# Altium integrated library ALTIUM-WR-CRD.IntLib: 18 symbols
Pins are listed as number, name and electrical type; pins without a type are passive.

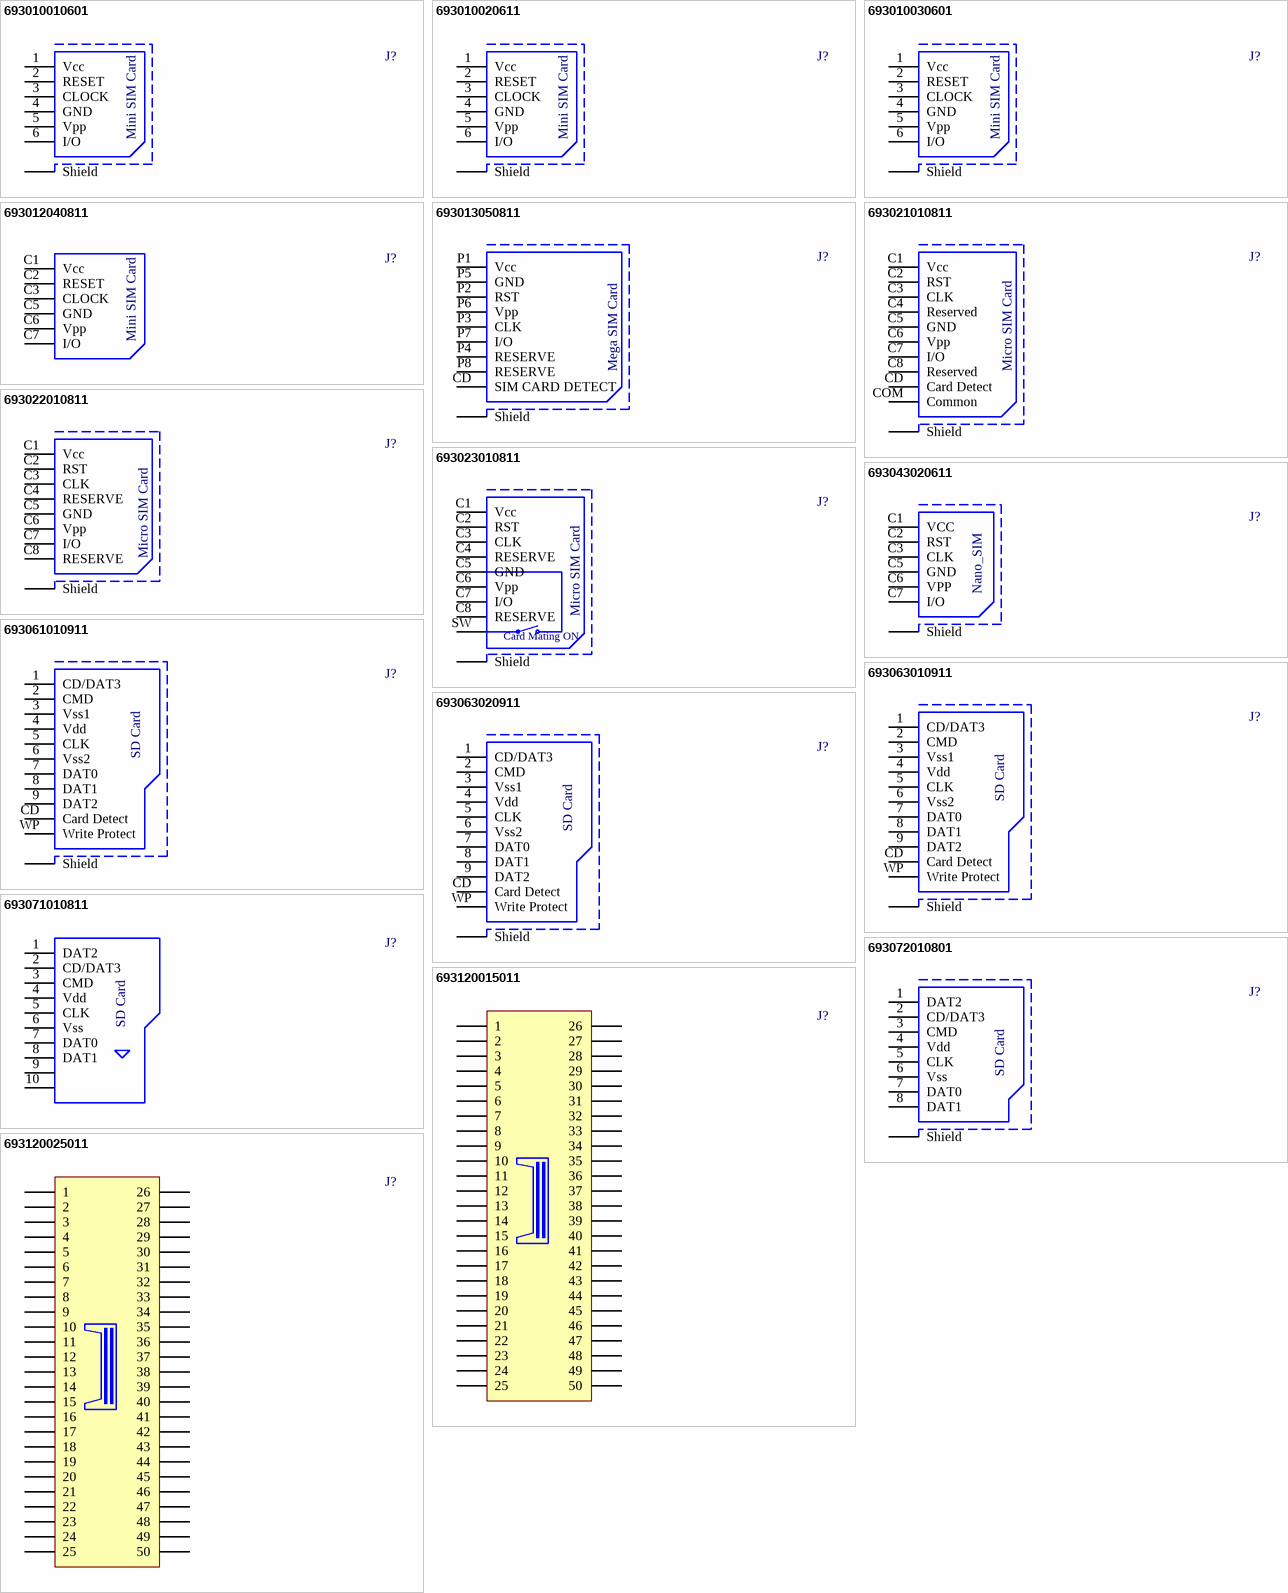
[diagram p0: symbols 693010010601 to 693120025011]

## 693010010601
designator J?
WR-CRD SIM Card Connector (Mini SIM) Header - 6 pins; PartNumber: 693010010601; Published: June 2016; Publisher: Wurth Elektronik; ComponentLink1Description: Manufacturer; ComponentLink1URL: http://www.we-online.de; ComponentLink2Description: Datasheet; ComponentLink2URL: http://katalog.we-online.de/em/datasheet/693010010601.pdf
footprint 693010010601 (WR-CRD Mini SIM_Standard Header 6 pins    1.7 Heigth)
pins: 1 Vcc, 2 RESET, 3 CLOCK, 4 GND, 5 Vpp, 6 I/O, Shield
text: Mini SIM Card

## 693010020611
designator J?
WR-CRD SIM Card Connector (Mini SIM) Header Shielded - 6 pins; PartNumber: 693010020611; Published: June 2016; Publisher: Wurth Elektronik; ComponentLink1Description: Manufacturer; ComponentLink1URL: http://www.we-online.de; ComponentLink2Description: Datasheet; ComponentLink2URL: http://katalog.we-online.de/em/datasheet/693010020611.pdf
footprint 693010020611 (WR-CRD Mini SIM_header_Shielded_6 pins    1.8 Heigth)
pins: 1 Vcc, 2 RESET, 3 CLOCK, 4 GND, 5 Vpp, 6 I/O, Shield
text: Mini SIM Card

## 693010030601
designator J?
WR-CRD SIM Card Connector (Mini SIM) Header Shielded - without card stop - 6 pins; PartNumber: 693010030601; Published: June 2016; Publisher: Wurth Elektronik; ComponentLink1Description: Manufacturer; ComponentLink1URL: http://www.we-online.de; ComponentLink2Description: Datasheet; ComponentLink2URL: http://katalog.we-online.de/em/datasheet/693010030601.pdf
footprint 693010030601 (WR-CRD Mini SIM_Card Stop_header_Shielded_ W/O card stop   6 pins    1.8 Heigth)
pins: 1 Vcc, 2 RESET, 3 CLOCK, 4 GND, 5 Vpp, 6 I/O, Shield
text: Mini SIM Card

## 693012040811
designator J?
WR-CRD SIM Card Connector (Mini SIM) - Hinge - 6 pins; PartNumber: 693012040811; Published: June 2016; Publisher: Wurth Elektronik; ComponentLink1Description: Manufacturer; ComponentLink1URL: http://www.we-online.de; ComponentLink2Description: Datasheet; ComponentLink2URL: http://katalog.we-online.de/em/datasheet/693012040811.pdf
footprint 693012040811 (WR-CRD mini SIM_Hinge type_6 pins_with cover shell_Housing Height 1.80mm)
pins: C1 Vcc, C2 RESET, C3 CLOCK, C5 GND, C6 Vpp, C7 I/O
text: Mini SIM Card

## 693013050811
designator J?
WR-CRD SIM Card Connector (Mega SIM) - Push & Push - with Card Detection - 8 pins; PartNumber: 693013050811; Published: June 2016; Publisher: Wurth Elektronik; ComponentLink1Description: Manufacturer; ComponentLink1URL: http://www.we-online.de; ComponentLink2Description: Datasheet; ComponentLink2URL: http://katalog.we-online.de/em/datasheet/693013050811.pdf
footprint 693013050811 (WR-CRD Mega SIM_Push and Push_8 pins_with Card Detection_Housing Height 1.50mm)
pins: CD SIM CARD DETECT, P1 Vcc, P2 RST, P3 CLK, P4 RESERVE, P5 GND, P6 Vpp, P7 I/O, P8 RESERVE, Shield
text: Mega SIM Card

## 693021010811
designator J?
WR-CRD Micro SIM Card Connector, Push & Push - with Card Detection; PartNumber: 693021010811; Published: Oct. 2016; Publisher: Wurth Elektronik; ComponentLink1Description: Manufacturer; ComponentLink1URL: http://www.we-online.de; ComponentLink2Description: Datasheet; ComponentLink2URL: http://katalog.we-online.de/em/datasheet/693021010811.pdf
footprint 693021010811 (Micro SIM Push & Push Type SMT - with Card Detection - 1.25mm Height)
pins: C1 Vcc, C2 RST, C3 CLK, C4 Reserved, C5 GND, C6 Vpp, C7 I/O, C8 Reserved, CD Card Detect, COM Common, Shield
text: Micro SIM Card

## 693022010811
designator J?
WR-CRD Micro SIM Card Connector Hinge Type; PartNumber: 693022010811; Published: June 2016; Publisher: Wurth Elektronik; ComponentLink1Description: Manufacturer; ComponentLink1URL: http://www.we-online.de; ComponentLink2Description: Datasheet; ComponentLink2URL: http://katalog.we-online.de/em/datasheet/693022010811.pdf
footprint 693022010811
pins: C1 Vcc, C2 RST, C3 CLK, C4 RESERVE, C5 GND, C6 Vpp, C7 I/O, C8 RESERVE, Shield
text: Micro SIM Card

## 693023010811
designator J?
WR-CRD Micro SIM Card Connector, Push & Push - with Card Detection; PartNumber: 693023010811; Published: June 2016; Publisher: Wurth Elektronik; ComponentLink1Description: Manufacturer; ComponentLink1URL: http://www.we-online.de; ComponentLink2Description: Datasheet; ComponentLink2URL: http://katalog.we-online.de/em/datasheet/693023010811.pdf
footprint 693023010811
pins: C1 Vcc, C2 RST, C3 CLK, C4 RESERVE, C5 GND, C6 Vpp, C7 I/O, C8 RESERVE, Shield, SW
text: Micro SIM Card; Card Mating ON

## 693043020611
designator J?
WR-CRD Nano SIM Card Connector, Push & Pull; PartNumber: 693043020611; Published: June 2016; Publisher: Wurth Elektronik; ComponentLink1Description: Manufacturer; ComponentLink1URL: http://www.we-online.de; ComponentLink2Description: Datasheet; ComponentLink2URL: http://katalog.we-online.de/em/datasheet/693043020611.pdf
footprint 693043020611
pins: C1 VCC, C2 RST, C3 CLK, C5 GND, C6 VPP, C7 I/O, Shield
text: Nano_SIM

## 693061010911
designator J?
WR-CRD SD Card Connector Push & Push - with Card Detection - 9 pins; PartNumber: 693061010911; Published: June 2016; Publisher: Wurth Elektronik; ComponentLink1Description: Manufacturer; ComponentLink1URL: http://www.we-online.de; ComponentLink2Description: Datasheet; ComponentLink2URL: http://katalog.we-online.de/em/datasheet/693061010911.pdf
footprint 693061010911 (WR-CRD SD_Push and Push_with card detection_9 pins)
pins: 1 CD/DAT3, 2 CMD, 3 Vss1, 4 Vdd, 5 CLK, 6 Vss2, 7 DAT0, 8 DAT1, 9 DAT2, CD Card Detect, Shield, WP Write Protect
text: SD Card

## 693063010911
designator J?
WR-CRD SD Card Connector Push & Pull - with Card Detection - 9 pins; PartNumber: 693063010911; Published: June 2016; Publisher: Wurth Elektronik; ComponentLink1Description: Manufacturer; ComponentLink1URL: http://www.we-online.de; ComponentLink2Description: Datasheet; ComponentLink2URL: http://katalog.we-online.de/em/datasheet/693063010911.pdf
footprint 693063010911 (WR-CRD SD_Push and Pull_with card detection_9 pins)
pins: 1 CD/DAT3, 2 CMD, 3 Vss1, 4 Vdd, 5 CLK, 6 Vss2, 7 DAT0, 8 DAT1, 9 DAT2, CD Card Detect, Shield, WP Write Protect
text: SD Card

## 693063020911
designator J?
WR-CRD SD Card Connector Push & Pull - Short Type - with Card Detection - 9 pins; PartNumber: 693063020911; Published: June 2016; Publisher: Wurth Elektronik; ComponentLink1Description: Manufacturer; ComponentLink1URL: http://www.we-online.de; ComponentLink2Description: Datasheet; ComponentLink2URL: http://katalog.we-online.de/em/datasheet/693063020911.pdf
footprint 693063020911 (WR-CRD SD_Push and Pull_Short Version with Card Detection_9 pins)
pins: 1 CD/DAT3, 2 CMD, 3 Vss1, 4 Vdd, 5 CLK, 6 Vss2, 7 DAT0, 8 DAT1, 9 DAT2, CD Card Detect, Shield, WP Write Protect
text: SD Card

## 693071010811
designator J?
WR-CRD Micro SD Card Connector Push & Push - 8 pins; PartNumber: 693071010811; Published: June 2016; Publisher: Wurth Elektronik; ComponentLink1Description: Manufacturer; ComponentLink1URL: http://www.we-online.de; ComponentLink2Description: Datasheet; ComponentLink2URL: http://katalog.we-online.de/em/datasheet/693071010811.pdf
footprint 693071010811 (WR-CRD Micro SD_Push and Push_Card Detection_8 pins)
pins: 1 DAT2, 2 CD/DAT3, 3 CMD, 4 Vdd, 5 CLK, 6 Vss, 7 DAT0, 8 DAT1, 9, 10
text: SD Card

## 693072010801
designator J?
WR-CRD Micro SD Card Connector - Hinge - 8 pins; PartNumber: 693072010801; Published: June 2016; Publisher: Wurth Elektronik; ComponentLink1Description: Manufacturer; ComponentLink1URL: http://www.we-online.de; ComponentLink2Description: Datasheet; ComponentLink2URL: http://katalog.we-online.de/em/datasheet/693072010801.pdf
footprint 693072010801 (WR-CRD Micro SD_Hinge_8 pins)
pins: 1 DAT2, 2 CD/DAT3, 3 CMD, 4 Vdd, 5 CLK, 6 Vss, 7 DAT0, 8 DAT1, Shield
text: SD Card

## 693120015011
designator J?
WR-CRD Compact Flash Card Connector - Header - 50 pins; PartNumber: 693120015011; Published: June 2016; Publisher: Wurth Elektronik; ComponentLink1Description: Manufacturer; ComponentLink1URL: http://www.we-online.de; ComponentLink2Description: Datasheet; ComponentLink2URL: http://katalog.we-online.de/em/datasheet/693120015011.pdf
footprint 693120015011 (WR-CRD Compact Flash_Header _50 pins)
pins: 1, 2, 3, 4, 5, 6, 7, 8, 9, 10, 11, 12, 13, 14, 15, 16, 17, 18, 19, 20, 21, 22, 23, 24, 25, 26, 27, 28, 29, 30, 31, 32, 33, 34, 35, 36, 37, 38, 39, 40, 41, 42, 43, 44, 45, 46, 47, 48, 49, 50

## 693120025011
designator J?
WR-CRD Compact Flash Card Connector - Header - Reverse type - 50 pins; PartNumber: 693120025011; Published: June 2016; Publisher: Wurth Elektronik; ComponentLink1Description: Manufacturer; ComponentLink1URL: http://www.we-online.de; ComponentLink2Description: Datasheet; ComponentLink2URL: http://katalog.we-online.de/em/datasheet/693120025011.pdf
footprint 693120025011 (WR-CRD Compact Flash_Reverse Header_50 pins)
pins: 1, 2, 3, 4, 5, 6, 7, 8, 9, 10, 11, 12, 13, 14, 15, 16, 17, 18, 19, 20, 21, 22, 23, 24, 25, 26, 27, 28, 29, 30, 31, 32, 33, 34, 35, 36, 37, 38, 39, 40, 41, 42, 43, 44, 45, 46, 47, 48, 49, 50

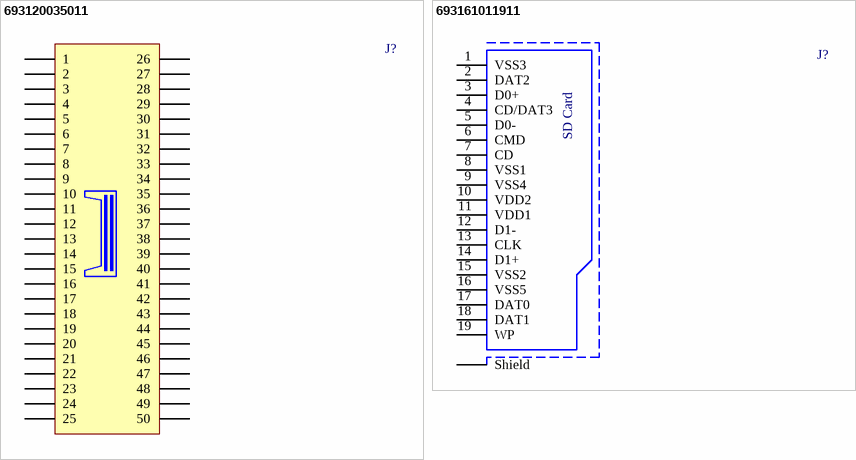
[diagram p1: symbols 693120035011 to 693161011911]

## 693120035011
designator J?
WR-CRD Compact Flash Card Connector - Header - Shrouded type - 50 pins; PartNumber: 693120035011; Published: June 2016; Publisher: Wurth Elektronik; ComponentLink1Description: Manufacturer; ComponentLink1URL: http://www.we-online.de; ComponentLink2Description: Datasheet; ComponentLink2URL: http://katalog.we-online.de/em/datasheet/693120035011.pdf
footprint 693120035011 (WR-CRD Compact Flash_Shrouded _50 pins)
pins: 1, 2, 3, 4, 5, 6, 7, 8, 9, 10, 11, 12, 13, 14, 15, 16, 17, 18, 19, 20, 21, 22, 23, 24, 25, 26, 27, 28, 29, 30, 31, 32, 33, 34, 35, 36, 37, 38, 39, 40, 41, 42, 43, 44, 45, 46, 47, 48, 49, 50

## 693161011911
designator J?
WR-CRD SD Card Connector 4.0 Push & Push with Card Detection - 19 pins; PartNumber: 693161011911; Published: June 2016; Publisher: Wurth Elektronik; ComponentLink1Description: Manufacturer; ComponentLink1URL: http://www.we-online.de; ComponentLink2Description: Datasheet; ComponentLink2URL: http://katalog.we-online.com/em/datasheet/693161011911.pdf
footprint 693161011911 (WR-CRD SD Card Connector 4.0 Push & Push with Card Detection - 19 pins)
pins: 1 VSS3, 2 DAT2, 3 D0+, 4 CD/DAT3, 5 D0-, 6 CMD, 7 CD, 8 VSS1, 9 VSS4, 10 VDD2, 11 VDD1, 12 D1-, 13 CLK, 14 D1+, 15 VSS2, 16 VSS5, 17 DAT0, 18 DAT1, 19 WP, Shield
text: SD Card